# Altium integrated library ER100_ESC.IntLib: 15 symbols
Pins are listed as number, name and electrical type; pins without a type are passive.

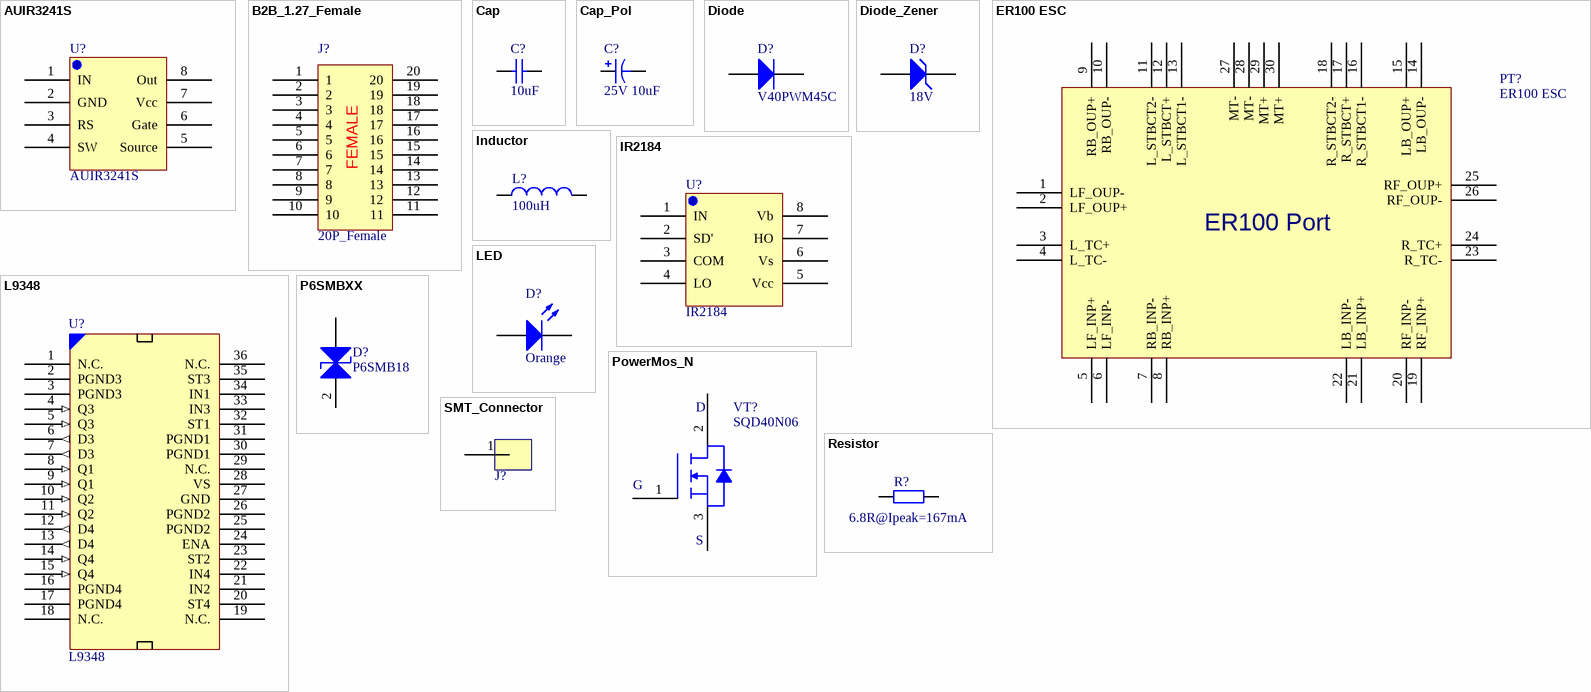
[diagram p0: symbols AUIR3241S to SMT_Connector]

## AUIR3241S
designator U?
B2B MOSFET Driver
footprint SOP8
pins: 1 IN, 2 GND, 3 RS, 4 SW, 5 Source, 6 Gate, 7 Vcc, 8 Out

## B2B_1.27_Female
designator J?, comment 20P_Female
板对板连接器 母头
footprint B2B_1.27_Female
pins: 1, 2, 3, 4, 5, 6, 7, 8, 9, 10, 11, 12, 13, 14, 15, 16, 17, 18, 19, 20
text: FEMALE

## Cap
designator C?, comment 10uF
无极性电容
footprint C 0805
footprint C 0603
footprint C 1206
pins: 1, 2

## Cap_Pol
designator C?, comment 25V 10uF
极性电容
footprint CP 6.3*5.5
footprint CP 8*6.2
footprint CP 3528B
pins: 1, 2

## Diode
designator D?, comment V40PWM45C
二极管
footprint DO-214
footprint LL34
footprint TO252_DIO
pins: 1 A, 2 K

## Diode_Zener
designator D?, comment 18V
footprint LL34
footprint DO-214AC
pins: 1 A, 2 K

## ER100 ESC
designator PT?
ER100元件接口
footprint ER100 Port
pins: 1 LF_OUP-, 2 LF_OUP+, 3 L_TC+, 4 L_TC-, 5 LF_INP+, 6 LF_INP-, 7 RB_INP-, 8 RB_INP+, 9 RB_OUP+, 10 RB_OUP-, 11 L_STBCT2-, 12 L_STBCT+, 13 L_STBCT1-, 14 LB_OUP-, 15 LB_OUP+, 16 R_STBCT1-, 17 R_STBCT+, 18 R_STBCT2-, 19 RF_INP+, 20 RF_INP-, 21 LB_INP+, 22 LB_INP-, 23 R_TC-, 24 R_TC+, 25 RF_OUP+, 26 RF_OUP-, 27 MT-, 28 MT-, 29 MT+, 30 MT+
text: ER100 Port

## Inductor
designator L?, comment 100uH
电感
footprint L 0603
footprint L 0805
footprint L 1206
footprint L 7*7
footprint L 1812
pins: 1, 2

## IR2184
designator U?
Half-Bridge Gate Driver
footprint SOP8
pins: 1 IN, 2 SD', 3 COM, 4 LO, 5 Vcc, 6 Vs, 7 HO, 8 Vb

## L9348
designator U?
4路电磁阀驱动
footprint PowerSO-36 (SOP, 36-Leads, Body 15.90x11.00mm, Pitch 0.65mm, Thermal Pad 9.80.2x6.20.2mm, IPC Medium Density)
pins: 1 N.C., 2 PGND3, 3 PGND3, 4 Q3 (in), 5 Q3 (in), 6 D3 (out), 7 D3 (out), 8 Q1 (in), 9 Q1 (in), 10 Q2 (in), 11 Q2 (in), 12 D4 (out), 13 D4 (out), 14 Q4 (in), 15 Q4 (in), 16 PGND4, 17 PGND4, 18 N.C., 19 N.C., 20 ST4, 21 IN2, 22 IN4, 23 ST2, 24 ENA, 25 PGND2, 26 PGND2, 27 GND, 28 VS, 29 N.C., 30 PGND1, 31 PGND1, 32 ST1, 33 IN3, 34 IN1, 35 ST3, 36 N.C.

## LED
designator D?, comment Orange
发光二极管
footprint LED-3mm
footprint LED-5mm
footprint LED_0805
footprint LED_1206
footprint LED_5050
footprint LED_0603
pins: 1 A, 2 K

## P6SMBXX
designator D?, comment P6SMB18
BiDir TVS Diode
footprint DO-214AA (Molded Diode, 2-Leads, Body 4.31x3.62mm, IPC Medium Density)
pins: 1 A, 2 K

## PowerMos_N
designator VT?, comment SQD40N06
footprint TO252
footprint TO263-3B
pins: 1 G, 2, 3
text: D; S

## Resistor
designator R?, comment 6.8R@Ipeak=167mA
电阻
footprint R 0603
footprint R 0805
footprint R 1206
footprint R 2512
pins: 1, 2

## SMT_Connector
designator J?  (value not drawn)
表贴接线端
footprint SMT_Connector
pins: 1